# Altium footprint library Item_pcb.PcbLib: 282 footprints (part 5 of 18)
Each footprint in its own frame and in the unit in brackets; x right, y up, seen from the top. Pads: shape width x height; smd on the part's side, far side on the other; paste and mask are expansions set on the pad; w line width, h text height; cw(c..) or ccw(c..) is an arc to the next point about the centre after c.
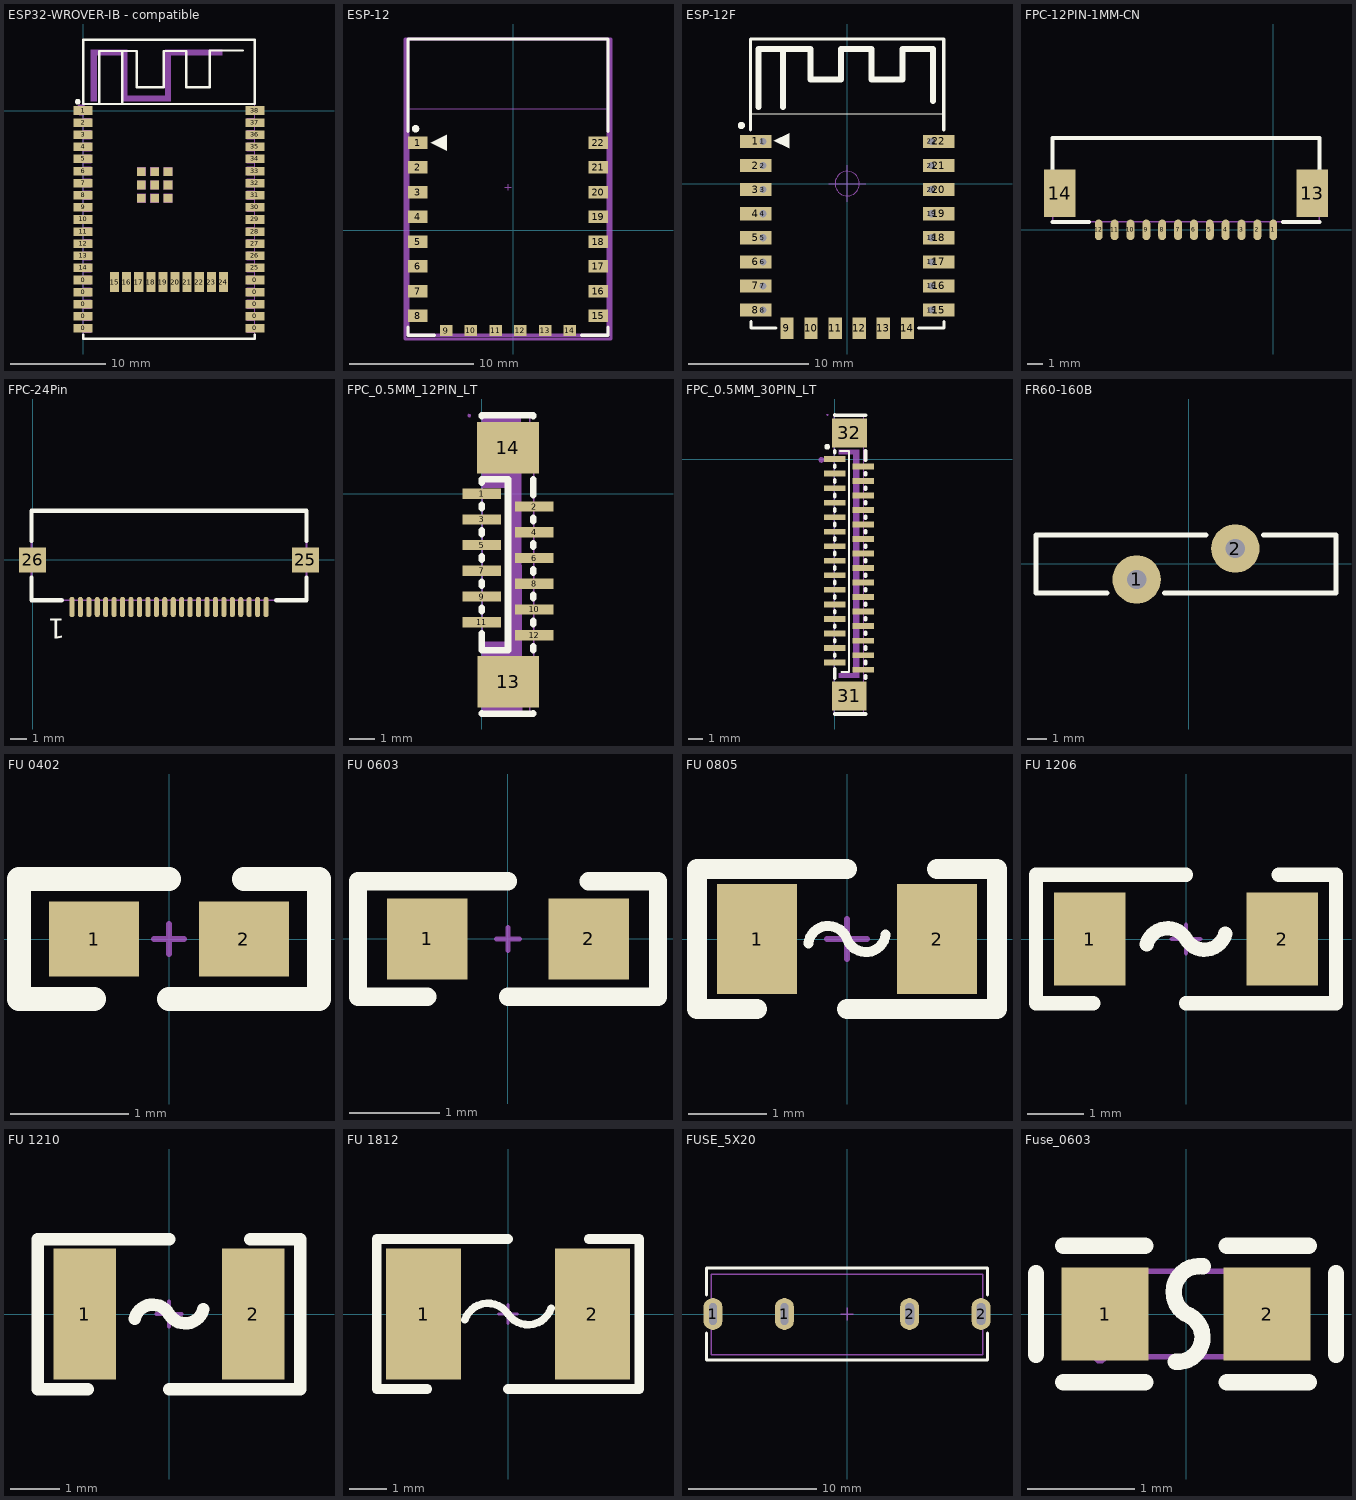
[diagram p4: the footprints below, top view; thin cyan lines are the x and y axes]

## ESP32-WROVER-IB - compatible [mm] "18*31.4*3.3"
pads (57):
  rect 2x0.9 smd: 0(0,-22.86) 0(0,-21.59) 0(0,-20.32) 0(0,-19.05) 0(0,-17.78) 0(18,-22.86) 0(18,-21.59) 0(18,-20.32) 0(18,-19.05) 0(18,-17.78) 1(0,0) 2(0,-1.27) 3(0,-2.54) 4(0,-3.81) 5(0,-5.08) 6(0,-6.35) 7(0,-7.62) 8(0,-8.89) 9(0,-10.16) 10(0,-11.43) 11(0,-12.7) 12(0,-13.97) 13(0,-15.24) 14(0,-16.51) 25(18,-16.51) 26(18,-15.24) 27(18,-13.97) 28(18,-12.7) 29(18,-11.43) 30(18,-10.16) 31(18,-8.89) 32(18,-7.62) 33(18,-6.35) 34(18,-5.08) 35(18,-3.81) 36(18,-2.54) 37(18,-1.27) 38(18,0)
  rect 0.95x2.1 smd: 15(3.285,-18.005) 16(4.555,-18.005) 17(5.825,-18.005) 18(7.095,-18.005) 19(8.365,-18.005) 20(9.635,-18.005) 21(10.905,-18.005) 22(12.175,-18.005) 23(13.445,-18.005) 24(14.715,-18.005)
  rect 0.9x0.9 smd: 39(6.105,-9.205) 39(6.105,-7.81) 39(6.105,-6.415) 39(7.5,-6.415) 39(7.5,-9.205) 39(7.5,-7.81) 39(8.895,-9.205) 39(8.895,-7.81) 39(8.895,-6.415)
Top Overlay:
  circle w0.3: c-0.57,0.92 r0.15
  lines w0.254: -0.001,-23.542 -0.001,-23.961 0.009,-23.961 18,-23.961 18,-23.542 ; 1.696,0.682 1.696,6.24 5.63,6.24 5.63,2.44 8.45,2.44 8.45,6.24 10.83,6.24 10.83,2.44 13.289,2.44 13.289,6.29 16.751,6.29 ; 4.099,0.681 4.099,6.24 4.442,6.24 ; 17.99,7.44 0,7.44 0,0.681 18,0.681 18,7.44
Mechanical 6:
  circle w0.6: c-0.2,0.05 r0.3
  region: 0.8,0.97 0.8,6.37 1.4,6.37 1.4,0.97
  region: 1.4,6.37 4,6.37 4,5.77 1.4,5.77
  region: 4,6.37 4.6,6.37 4.6,0.97 4,0.97
  region: 4.6,0.97 8.6,0.97 8.6,1.57 4.6,1.57
  region: 8.6,0.97 8.6,6.37 9.2,6.37 9.2,0.97
  region: 9.2,6.37 14.6,6.37 14.6,5.77 9.2,5.77
Mechanical 15:
  drawing of 52 lines, arcs and shapes, not listed
3D body "3D_PCB2_2024-03-27-ESP32_end.STEP": height 3.4, standoff 0.2, extent 0.034,-17.982 18.034,1.218

## ESP-12 [mm]
pads (22):
  rect 1.6x1 smd: 1(-7.732,7.072) 2(-7.732,5.072) 3(-7.732,3.072) 4(-7.732,1.072) 5(-7.732,-0.928) 6(-7.732,-2.928) 7(-7.732,-4.928) 8(-7.732,-6.928) 15(6.868,-6.928) 16(6.868,-4.928) 17(6.868,-2.928) 18(6.868,-0.928) 19(6.868,1.072) 20(6.868,3.072) 21(6.868,5.072) 22(6.868,7.072)
  rect 1x0.9 smd: 9(-5.432,-8.128) 10(-3.432,-8.128) 11(-1.432,-8.128) 12(0.568,-8.128) 13(2.568,-8.128) 14(4.568,-8.128)
Top Overlay:
  circle w0.3: c-7.907,8.197 r0.15
  region: -6.662,7.072 -5.392,6.437 -5.392,7.707
  lines w0.254: -8.515,-7.844 -8.515,-8.496 -6.363,-8.496 ; -8.515,7.988 -8.515,15.443 7.652,15.443 7.652,7.988 ; 5.5,-8.496 7.652,-8.496 7.652,-7.844
Mechanical 13:
  lines w0.051: -8.559,9.799 7.697,9.799 7.697,15.454 -8.559,15.454 -8.559,9.799
  lines w0.254: -8.515,-8.496 -8.515,15.443 7.652,15.443 7.652,-8.496 -8.515,-8.496
Mechanical 15:
  lines w0.1: -0.686,3.474 -0.178,3.474 ; -0.432,3.22 -0.432,3.728
  lines w0.254: -8.757,-8.803 7.893,-8.803 7.893,15.443 -8.757,15.443 -8.757,-8.803
3D body "ESP_12_E.STEP": height 2.75, standoff 0.04, extent -8.431,-8.419 7.569,15.581

## ESP-12F [mm] "ESP-12E&F"
height 3.2
pads (38):
  rect 2.6x1.1 smd: 1(-7.6,3.5) 2(-7.6,1.5) 3(-7.6,-0.5) 4(-7.6,-2.5) 5(-7.6,-4.5) 6(-7.6,-6.5) 7(-7.6,-8.5) 8(-7.6,-10.5) 15(7.6,-10.5) 16(7.6,-8.5) 17(7.6,-6.5) 18(7.6,-4.5) 19(7.6,-2.5) 20(7.6,-0.5) 21(7.6,1.5) 22(7.6,3.5)
  rect 0.762x1 hole 0.6: 1(-7,3.5) 7(-7,-8.5)
  rect 0.762x1 / inner rect 0.762x1 / far side rect 1x1 hole 0.6: 2(-7,1.5) 3(-7,-0.5) 4(-7,-2.5) 5(-7,-4.5) 6(-7,-6.5) 8(-7,-10.5) 15(7,-10.5) 16(7,-8.5) 17(7,-6.5) 18(7,-4.5) 19(7,-2.5) 20(7,-0.5) 21(7,1.5) 22(7,3.5)
  rect 1.1x1.8 smd: 9(-5,-12) 10(-3,-12) 11(-1,-12) 12(1,-12) 13(3,-12) 14(5,-12)
Top Overlay:
  circle w0.3: c-8.786,4.826 r0.15
  region: -6.096,3.556 -4.826,2.921 -4.826,4.191
  lines w0.1: -8,5.8 8,5.8
  lines w0.254: -8.01,4.454 -8.01,12 ; -8.001,-11.43 -8,-11.431 -8,-12 -5.907,-12 ; -8,12 8,12 ; 5.907,-12 8,-12 ; 8.01,4.454 8.01,12 ; 8.02,-12 8.02,-11.431
  lines w0.5: -7.366,6.35 -7.366,11.176 -3.048,11.176 -3.048,8.636 -0.508,8.636 -0.508,11.176 2.032,11.176 2.032,8.636 4.572,8.636 4.572,11.176 7.112,11.176 7.112,6.858 ; -5.334,6.35 -5.334,11.176
Mechanical 15:
  circle w0.1: c0,0 r1.016
  lines w0.1: -1.524,0 1.524,0 ; 0,-1.524 0,1.524
3D body "ESP-12E&F.STEP": height 3.35, standoff 0.02, extent -8.01,-12.01 8.01,12

## FPC-12PIN-1MM-CN [mm]
pads (14):
  oval 0.5x1.3 smd: 1(0,0) 2(-1,0) 3(-2,0) 4(-3,0) 5(-4,0) 6(-5,0) 7(-6,0) 8(-7,0) 9(-8,0) 10(-9,0) 11(-10,0) 12(-11,0)
  rect 2x3 smd: 13(2.454,2.299) 14(-13.454,2.299)
Top Overlay:
  lines w0.25: -13.9,0.5 -11.6,0.5 ; -13.9,3.8 -13.9,5.8 2.9,5.8 2.9,3.8 ; 0.6,0.5 2.9,0.5
Mechanical 15:
  lines w0.1: -13.9,0.5 -13.9,5.8 2.9,5.8 2.9,0.5 -13.9,0.5
3D body "HEADER-FPC-ZIF-SMD-Horizontal-1.0-12.stp": height 2.2, standoff -0.05, extent -13.8,-0.299 2.8,6.2

## FPC-24Pin [mm]
pads (26):
  oval 0.3x1.2 smd: 1(2.335,-2.789) 2(2.835,-2.789) 3(3.335,-2.789) 4(3.835,-2.789) 5(4.335,-2.789) 6(4.835,-2.789) 7(5.335,-2.789) 8(5.835,-2.789) 9(6.335,-2.789) 10(6.835,-2.789) 11(7.335,-2.789) 12(7.835,-2.789) 13(8.335,-2.789) 14(8.835,-2.789) 15(9.335,-2.789) 16(9.835,-2.789) 17(10.335,-2.789) 18(10.835,-2.789) 19(11.335,-2.789) 20(11.835,-2.789) 21(12.335,-2.789) 22(12.835,-2.789) 23(13.335,-2.789) 24(13.835,-2.789)
  rect 1.6x1.5 smd: 25(16.17,0) 26(0,0)
Top Overlay:
  lines w0.25: -0.065,-1.042 -0.065,-2.39 1.735,-2.39 ; -0.065,1.117 -0.065,2.91 16.235,2.91 16.235,1.117 ; 14.435,-2.39 16.235,-2.39 16.235,-1.042
  text "1" at 1.93,-3.073 h2.03
Mechanical 15:
  lines w0.1: -0.065,-2.39 -0.065,2.91 16.235,2.91 16.235,-2.39 -0.065,-2.39
3D body "HEADER-FPC-ZIF-SMD-Horizontal-0.5-24.stp": height 2.2, standoff -0.05, extent 0.035,-2.996 16.135,3.503

## FPC_0.5MM_12PIN_LT [mm] "0.5MM"
pads (14):
  rect 1.5x0.4 smd: 1(0,0) 2(2.027,-0.5) 3(0,-1.001) 4(2.027,-1.501) 5(0,-1.999) 6(2.027,-2.502) 7(0,-3) 8(2.027,-3.502) 9(0,-4) 10(2.027,-4.501) 11(0,-4.999) 12(2.027,-5.501)
  rect 2.4x2 smd: 13(1.024,-7.31) 14(1.009,1.785)
Top Overlay:
  lines w0.254: -0.001,-8.542 -0.001,-8.558 1.999,-8.558 1.999,-8.542 ; -0.001,-5.43 -0.001,-6.079 1.014,-6.079 1.014,-5.643 1.014,0.553 -0.001,0.553 -0.001,0.431 ; -0.001,-4.568 -0.001,-4.432 ; -0.001,-3.569 -0.001,-3.431 ; -0.001,-2.569 -0.001,-2.43 ; -0.001,-1.568 -0.001,-1.432 ; -0.001,-0.57 -0.001,-0.431 ; -0.001,3.016 -0.001,3.042 1.999,3.042 1.999,3.016 ; 1.999,-6.079 1.999,-5.932 ; 1.999,-5.07 1.999,-4.932 ; 1.999,-4.07 1.999,-3.933 ; 1.999,-3.071 1.999,-2.933 ; 1.999,-2.071 1.999,-1.932 ; 1.999,-1.07 1.999,-0.931 ; 1.999,-0.069 1.999,0.553
Mechanical 6:
  region: 0.014,3.027 1.514,3.027 1.564,-8.563 0.014,-8.563 0.014,-5.763 1.014,-5.763 1.014,0.237 0.014,0.237
Mechanical 15:
  region: 0.109,1.035 0.109,2.535 1.909,2.535 1.909,1.035
  region: 0.124,-8.06 0.124,-6.56 1.924,-6.56 1.924,-8.06
  region: -0.486,-0.1 -0.486,0.1 0.214,0.1 0.214,-0.1
  region: 1.814,-0.6 1.814,-0.4 2.514,-0.4 2.514,-0.6
  region: -0.486,-1.101 -0.486,-0.901 0.214,-0.901 0.214,-1.101
  region: 1.814,-1.601 1.814,-1.401 2.514,-1.401 2.514,-1.601
  region: -0.486,-2.103 -0.486,-1.903 0.214,-1.903 0.214,-2.103
  region: 1.814,-2.603 1.814,-2.403 2.514,-2.403 2.514,-2.603
  region: -0.486,-3.1 -0.486,-2.9 0.214,-2.9 0.214,-3.1
  region: 1.814,-3.602 1.814,-3.402 2.514,-3.402 2.514,-3.602
  region: -0.486,-4.1 -0.486,-3.901 0.214,-3.901 0.214,-4.1
  region: 1.814,-4.601 1.814,-4.401 2.514,-4.401 2.514,-4.601
  region: -0.486,-5.099 -0.486,-4.899 0.214,-4.899 0.214,-5.099
  region: 1.814,-5.601 1.814,-5.401 2.514,-5.401 2.514,-5.601
  region: -0.426,3.037 -0.427,3.062 -0.462,3.096 -0.511,3.096 -0.546,3.062 -0.546,3.037 -0.546,3.013 -0.511,2.978 -0.462,2.978 -0.427,3.013
  lines w0.051: 0.009,-8.493 0.019,-8.513 0.039,-8.533 0.059,-8.553 0.079,-8.563 1.739,-8.563 1.779,-8.563 ccw(c1.779,-8.483) 1.859,-8.483 1.859,-7.863 1.874,-7.847 ccw(c1.55,-7.523) 2.009,-7.523 2.009,1.975 ccw(c1.497,1.975) 1.859,2.337 1.859,2.967 1.789,3.037 0.014,3.027 cw(c-0.02,3.022) 0.014,3.017 0.009,-8.493

## FPC_0.5MM_30PIN_LT [mm] "0.5mm"
pads (32):
  rect 1.5x0.4 smd: 1(0,0) 2(1.95,-0.5) 3(0,-1) 4(1.95,-1.5) 5(0,-2) 6(1.95,-2.5) 7(0,-3) 8(1.95,-3.5) 9(0,-4) 10(1.95,-4.5) 11(0,-5) 12(1.95,-5.5) 13(0,-6) 14(1.95,-6.5) 15(0,-7) 16(1.95,-7.5) 17(0,-8) 18(1.95,-8.5) 19(0,-9) 20(1.95,-9.5) 21(0,-10) 22(1.95,-10.5) 23(0,-11) 24(1.95,-11.5) 25(0,-12) 26(1.95,-12.5) 27(0,-13) 28(1.95,-13.5) 29(0,-14) 30(1.95,-14.5)
  rect 2.4x2 smd: 31(0.99,-16.3) 32(0.999,1.8)
Top Overlay:
  circle w0.2: c-0.525,0.85 r0.1
  lines w0.152: 0.375,0.55 0.975,0.55 0.975,-14.65 0.475,-14.65
  lines w0.254: -0.015,-17.531 -0.015,-17.55 1.975,-17.55 2.115,-17.55 2.115,-17.531 ; -0.015,-15.069 -0.015,-14.431 ; -0.015,-13.569 -0.015,-13.431 ; -0.015,-12.569 -0.015,-12.431 ; -0.015,-11.569 -0.015,-11.431 ; -0.015,-10.569 -0.015,-10.431 ; -0.015,-9.569 -0.015,-9.431 ; -0.015,-8.569 -0.015,-8.431 ; -0.015,-7.569 -0.015,-7.431 ; -0.015,-6.569 -0.015,-6.431 ; -0.015,-5.569 -0.015,-5.431 ; -0.015,-4.569 -0.015,-4.431 ; -0.015,-3.569 -0.015,-3.431 ; -0.015,-2.569 -0.015,-2.431 ; -0.015,-1.569 -0.015,-1.431 ; -0.015,-0.569 -0.015,-0.431 ; -0.015,0.431 -0.015,0.569 ; -0.015,3.04 -0.015,3.031 2.115,3.031 ; 2.115,-15.069 2.115,-14.931 ; 2.115,-14.069 2.115,-13.931 ; 2.115,-13.069 2.115,-12.931 ; 2.115,-12.069 2.115,-11.931 ; 2.115,-11.069 2.115,-10.931 ; 2.115,-10.069 2.115,-9.931 ; 2.115,-9.069 2.115,-8.931 ; 2.115,-8.069 2.115,-7.931 ; 2.115,-7.069 2.115,-6.931 ; 2.115,-6.069 2.115,-5.931 ; 2.115,-5.069 2.115,-4.931 ; 2.115,-4.069 2.115,-3.931 ; 2.115,-3.069 2.115,-2.931 ; 2.115,-2.069 2.115,-1.931 ; 2.115,-1.069 2.115,-0.931 ; 2.115,-0.069 2.115,0.569
Mechanical 6:
  circle w0.2: c-0.925,-0.05 r0.1
  region: 0.275,-15.05 1.675,-15.05 1.675,0.65 0.275,0.65 0.275,0.35 1.275,0.35 1.275,-14.75 0.275,-14.75
Mechanical 15:
  drawing of 37 lines, arcs and shapes, not listed

## FR60-160B [mm] "直径15.5mm，厚度3mm，脚距5.1mm"
pads (2):
  round 2.5 hole 1: 1(-2.7,-0.8) 2(2.4,0.8)
Top Overlay:
  lines w0.254: -4.216,-1.5 -7.899,-1.5 -7.899,1.5 0.889,1.499 ; -1.27,-1.499 7.601,-1.5 7.601,1.5 3.861,1.499
3D body "RF60-160B.STEP": height 18.5, standoff -3.5, extent -7.899,-1.5 7.601,1.5

## FU 0402 [mil] "贴片保险丝"
pads (2):
  rect 30x25 smd: 1(-25,0) 2(25,0)
Top Overlay:
  lines w8: -25,-20 -50,-20 -50,20 -40,20 -25,20 0,20 ; 0,-20 25,-20 50,-20 50,20 25,20
Mechanical 15:
  lines w2: -5,0 5,0 ; 0,-5 0,5
3D body "FU 0402.STEP": height 14.57, standoff 0, extent -19.69,-10.24 19.69,10.24

## FU 0603 [mil] "贴片保险丝"
pads (2):
  rect 35x35 smd: 1(-35,0) 2(35,0)
Top Overlay:
  lines w8: -35,-25 -65,-25 -65,25 -40,25 0,25 ; 0,-25 40,-25 65,-25 65,25 35,25
Mechanical 15:
  lines w2: -5,0 5,0 ; 0,-5 0,0 0,5
3D body "FU 0603.STEP": height 20.47, standoff 0, extent -31.5,-16.14 31.5,16.14

## FU 0805 [mil] "贴片保险丝"
pads (2):
  rect 40x55 smd: 1(-45,0) 2(45,0)
Top Overlay:
  lines w5: -19.33,-2.28 cw(c-9.4,-3.42) 0,0 ccw(c9.4,3.42) 19.33,2.28
  lines w10: -45,-35 -75,-35 -75,35 -45,35 0,35 ; 0,-35 60,-35 ; 45,35 75,35 75,-35 50,-35
Mechanical 15:
  lines w3: -10,0 10,0 ; 0,-10 0,10
3D body "FU 0805.STEP": height 20.47, standoff 0, extent -39.37,-24.02 39.37,24.02

## FU 1206 [mil] "贴片保险丝"
pads (2):
  rect 50x65 smd: 1(-67.5,0) 2(67.5,0)
Top Overlay:
  lines w10: -90,45 0,45 ; -65,-45 -105,-45 -105,45 -65,45 ; -27.48,-3.62 cw(c-12.99,-7.5) 0,0 ccw(c12.99,7.5) 27.48,3.62 ; 0,-45 90,-45 ; 65,-45 105,-45 105,45 65,45
Mechanical 15:
  lines w3: -10,0 10,0 ; 0,-10 0,10
3D body "FU 01206.STEP": height 34.25, standoff 0, extent -62.99,-31.89 62.99,31.89

## FU 1210 [mil] "贴片保险丝"
pads (2):
  rect 50x105 smd: 1(-67.5,0) 2(67.5,0)
Top Overlay:
  lines w10: -90,60 0,60 ; -65,-60 -105,-60 -105,60 -65,60 ; -27.48,-3.62 cw(c-12.99,-7.5) 0,0 ccw(c12.99,7.5) 27.48,3.62 ; 0,-60 90,-60 ; 65,-60 105,-60 105,60 65,60
Mechanical 15:
  lines w3: -10,0 10,0 ; 0,-10 0,10
3D body "FU 01210.STEP": height 34.25, standoff 0, extent -62.99,-50.39 62.99,50.39

## FU 1812 [mm] "贴片保险丝"
pads (2):
  rect 2x3.5 smd: 1(-2.25,0) 2(2.25,0)
Top Overlay:
  lines w0.203: -1.15,-0.156 cw(c-0.537,-0.362) 0,0 ccw(c0.537,0.362) 1.15,0.156
  lines w0.254: -2.159,-2 -3.5,-2 -3.5,2 0,2 ; 0,-2 3.5,-2 3.5,2 2.159,2
Mechanical 15:
  lines w0.076: -0.254,0 0.254,0 ; 0,-0.254 0,0.254
3D body "FU 01812.STEP": height 0.87, standoff 0, extent -2.3,-1.61 2.3,1.61

## FUSE_5X20 [mm]
pads (4):
  oval 1.5x2.5 hole 0.6 slot 1.7 at 90 deg: 1(-10.5,0) 1(-4.9,0)
  oval 1.5x2.5 hole 0.7 slot 1.7 at 90 deg: 2(4.9,0) 2(10.5,0)
Top Overlay:
  lines w0.254: -11,-1.5 -11,-3.6 11,-3.6 11,-1.5 ; -11,1.5 -11,3.6 11,3.6 11,1.5
Mechanical 15:
  lines w0.1: -0.5,0 0.5,0 ; 0,-0.5 0,0.5 ; -10.652,-3.2 10.626,-3.2 10.626,3.1 -10.652,3.1 -10.652,-3.2
3D body "Fuse.STEP": height 9.59, standoff -3.31, extent -10.652,-3.135 10.626,3.055

## Fuse_0603 [mil]
pads (2):
  rect 31.8x34 smd mask+2: 1(-29.7,0) 2(29.7,0)
Top Overlay:
  lines w6: -55,-15 -55,15 ; -45,-25 -15,-25 ; -45,25 -15,25 ; -3.78,-17.5 ccw(c-2.98,-8.52) 0,0 ; -0.04,0 cw(c4.98,8.08) 6.21,17.5 ; 15,-25 45,-25 ; 15,25 45,25 ; 55,-15 55,15
Top Paste:
  region: -12.4,-5.4 -12.4,5.4 -23.2,17 -43,17 -45.5,14.5 -45.5,-14.5 -43,-17 -23.2,-17
  region: 12.4,-5.4 12.4,5.4 23.2,17 43,17 45.5,14.5 45.5,-14.5 43,-17 23.2,-17
Mechanical 15:
  region: 31.5,-15.7 31.5,15.7 19.7,15.7 19.7,-15.7
  region: -31.5,-15.7 -31.5,15.7 -19.7,15.7 -19.7,-15.7
  region: -29.1,-15.7 -29.1,-14.71 -30.51,-13.3 -32.49,-13.3 -33.9,-14.71 -33.9,-15.7 -33.9,-16.69 -32.49,-18.1 -30.51,-18.1 -29.1,-16.69
  lines w2: -31.5,-15.7 31.5,-15.7 31.5,15.7 -31.5,15.7 -31.5,-15.7
3D body "3D_PCB5_2022-03-06.step": height 29.5, standoff 1.97, extent -32.92,-17.7 33.95,17.7